# Altium footprint library alex_footprint.PcbLib: 262 footprints (part 17 of 17)
Each footprint in its own frame and in the unit in brackets; x right, y up, seen from the top. Pads: shape width x height; smd on the part's side, far side on the other; paste and mask are expansions set on the pad; w line width, h text height; cw(c..) or ccw(c..) is an arc to the next point about the centre after c.
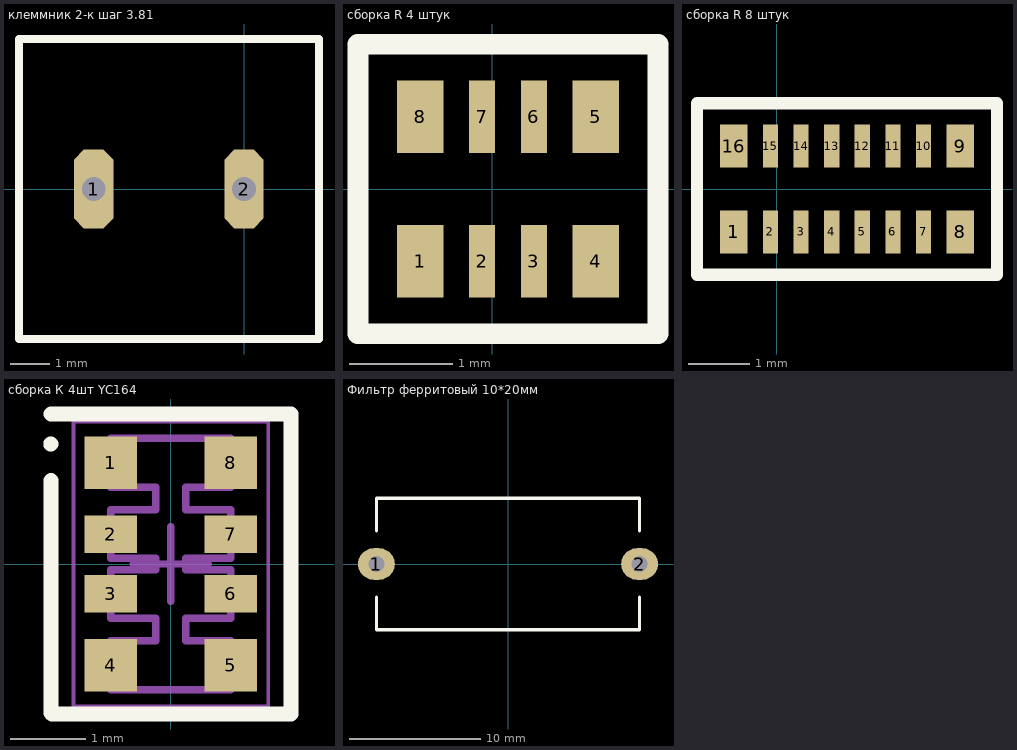
[diagram p16: the footprints below, top view; thin cyan lines are the x and y axes]

## клеммник 2-к шаг 3.81 [mm]
pads (2):
  oct 1x2 hole 0.6 unplated: 1(-3.81,0) 2(0,0)
Top Overlay:
  lines w0.2: -5.7,-3.8 -5.7,3.8 1.9,3.8 1.9,-3.8 -5.7,-3.8

## сборка R 4 штук [mm]
pads (8):
  rect 0.45x0.7 smd: 1(-0.7,-0.7) 4(1,-0.7) 5(1,0.7) 8(-0.7,0.7)
  rect 0.25x0.7 smd: 2(-0.1,-0.7) 3(0.4,-0.7) 6(0.4,0.7) 7(-0.1,0.7)
Top Overlay:
  lines w0.2: -1.3,-1.4 -1.3,1.4 1.6,1.4 1.6,-1.4 -1.3,-1.4

## сборка R 8 штук [mm]
pads (16):
  rect 0.45x0.7 smd: 1(-0.7,-0.7) 8(3,-0.7) 9(3,0.7) 16(-0.7,0.7)
  rect 0.25x0.7 smd: 2(-0.1,-0.7) 3(0.4,-0.7) 4(0.9,-0.7) 5(1.4,-0.7) 6(1.9,-0.7) 7(2.4,-0.7) 10(2.4,0.7) 11(1.9,0.7) 12(1.4,0.7) 13(0.9,0.7) 14(0.4,0.7) 15(-0.1,0.7)
Top Overlay:
  lines w0.2: -1.3,-1.4 -1.3,1.4 3.6,1.4 3.6,1.3 3.6,-1.4 -1.3,-1.4

## сборка R YC124/164 4 штуки [mm]

## сборка К 4шт YC164 [mm] "Chip Array, ConvexS, 8-Leads, Pitch 0,80mm,  Body 3,20x1,60mm,  IPC Low Density"
height 1
pads (8):
  rect 0.7x0.7 smd: 1(-0.8,1.35) 4(-0.8,-1.35) 5(0.8,-1.35) 8(0.8,1.35)
  rect 0.7x0.5 smd: 2(-0.8,0.4) 3(-0.8,-0.4) 6(0.8,-0.4) 7(0.8,0.4)
Top Overlay:
  circle w0.1: c-1.6,1.6 r0.05
  lines w0.2: -1.6,1.113 -1.6,0.338 -1.6,-1.212 -1.6,-1.987 -1.587,-2 1.6,-2 1.6,2 -1.6,2
Mechanical 13:
  lines w0.1: -0.8,-1.675 0.8,-1.675 0.8,-1.025 0.2,-1.025 0.2,-0.725 0.8,-0.725 0.8,-0.075 0.2,-0.075 0.2,0.075 0.8,0.075 0.8,0.725 0.2,0.725 0.2,1.025 0.8,1.025 0.8,1.675 -0.8,1.675 -0.8,1.025 -0.2,1.025 -0.2,0.725 -0.8,0.725 -0.8,0.075 -0.2,0.075 -0.2,-0.075 -0.8,-0.075 -0.8,-0.725 -0.2,-0.725 -0.2,-1.025 -0.8,-1.025 -0.8,-1.675
Mechanical 15:
  lines w0.05: -1.3,-1.9 1.3,-1.9 1.3,1.9 -1.3,1.9 -1.3,-1.9
  lines w0.1: -0.5,0 0.5,0 ; 0,-0.5 0,0.5
3D body: height 1, standoff 0, extent -0.9,-1.675 0.9,1.675

## Фильтр ферритовый 10*20мм [mm]
pads (2):
  oval 2.8x2.4 hole 1.2 unplated mask+0.25: 1(-10,0) 2(10,0)
Top Overlay:
  lines w0.25: -10,-2.5 -10,-5 10,-5 10,-2.5 ; -10,2.5 -10,5 10,5 10,2.5